# Altium schematic symbol library MCU_ST_STM32F4.SchLib: 211 symbols (part 10 of 10)
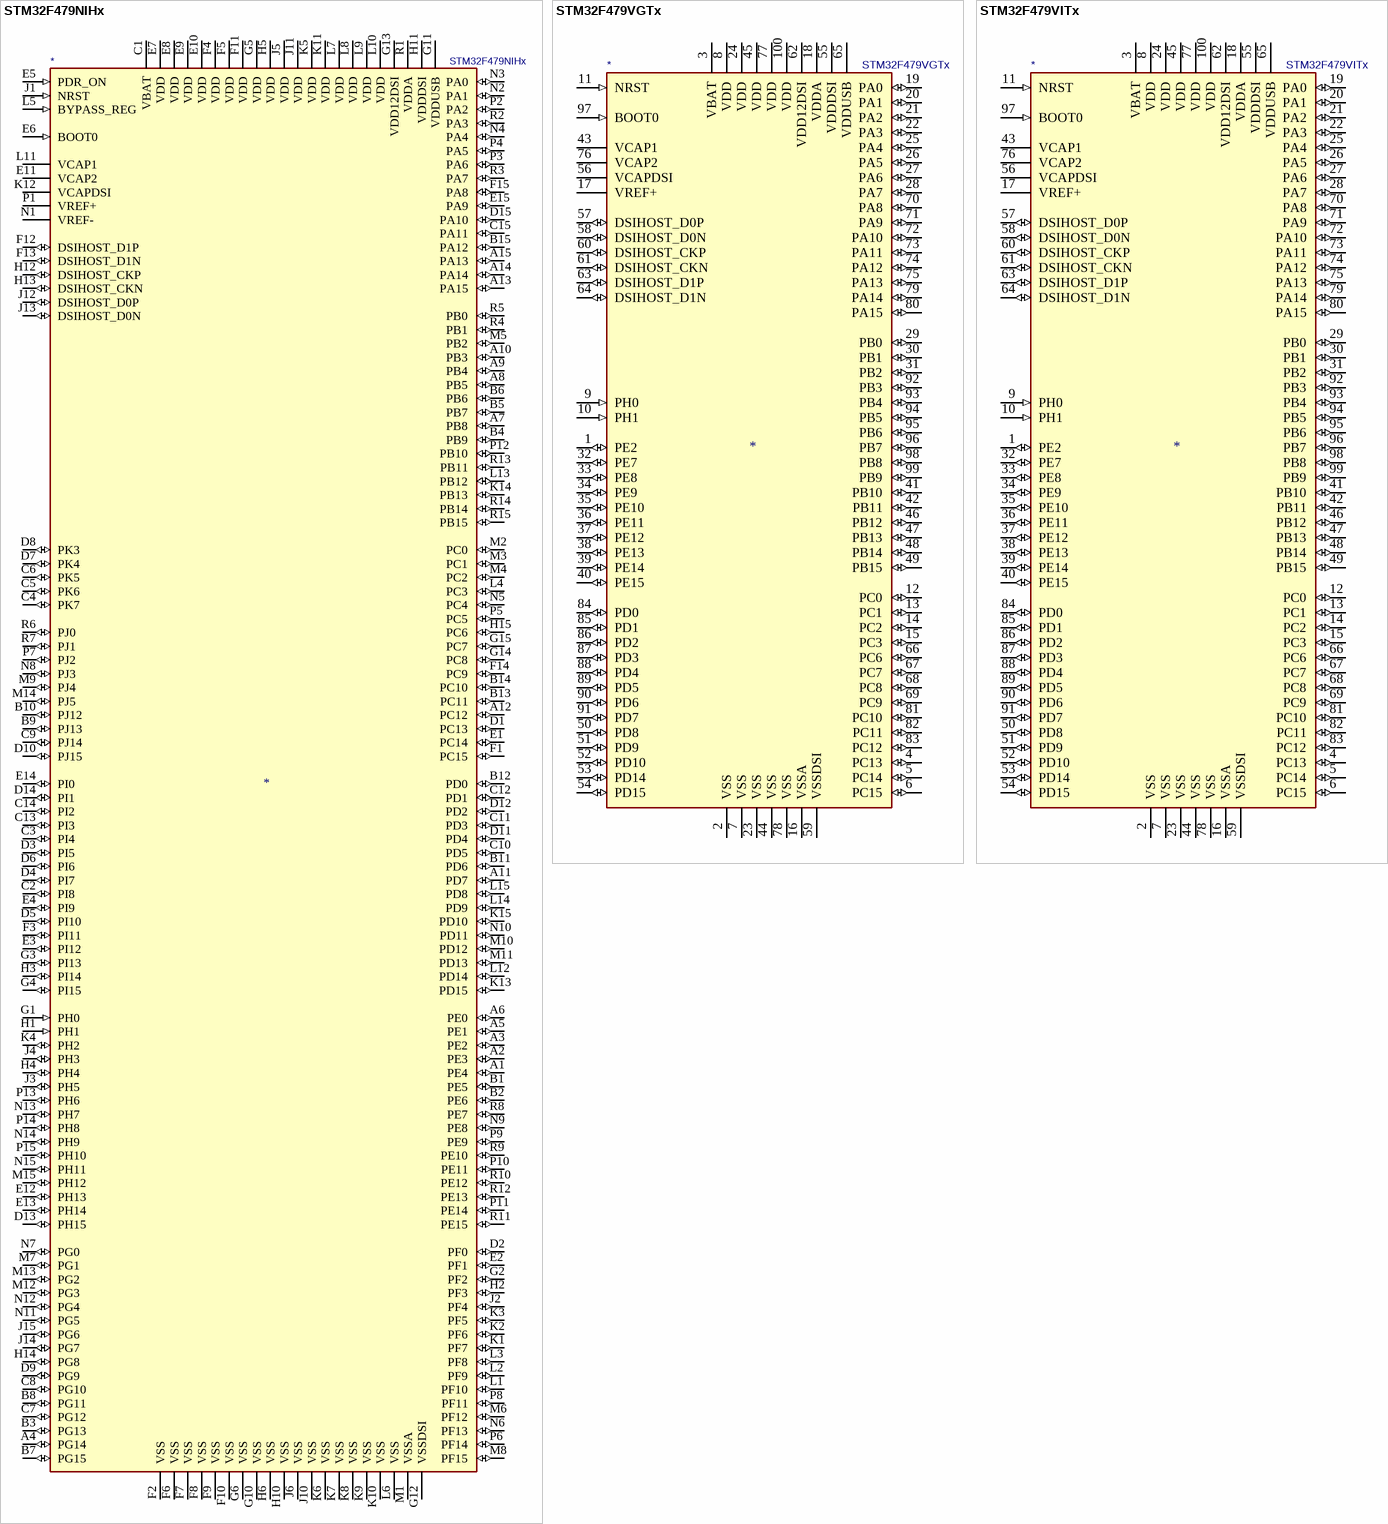
[diagram p71: symbols STM32F479NIHx to STM32F479VITx]

## STM32F479NIHx
designator *  value STM32F479NIHx
ki_keywords: ARM Cortex-M4 STM32F4 STM32F469/479; ki_description: ARM Cortex-M4 MCU, 2048KB flash, 320KB RAM, 180MHz, 1.7-3.6V, 159 GPIO, TFBGA-216; ki_fp_filters: TFBGA*13x13mm*Layout15x15*P0.8mm*; Footprint: Package_BGA:TFBGA-216_13x13mm_Layout15x15_P0.8mm; Supplier: http://www.st.com/st-web-ui/static/active/en/resource/technical/document/datasheet/DM00208574.pdf
footprint TFBGA-216_13x13mm_Layout15x15_P0.8mm
pins: A1 PE4 (io), A2 PE3 (io), A3 PE2 (io), A4 PG14 (io), A5 PE1 (io), A6 PE0 (io), A7 PB8 (io), A8 PB5 (io), A9 PB4 (io), A10 PB3 (io), A11 PD7 (io), A12 PC12 (io), A13 PA15 (io), A14 PA14 (io), A15 PA13 (io), B1 PE5 (io), B2 PE6 (io), B3 PG13 (io), B4 PB9 (io), B5 PB7 (io), B6 PB6 (io), B7 PG15 (io), B8 PG11 (io), B9 PJ13 (io), B10 PJ12 (io), B11 PD6 (io), B12 PD0 (io), B13 PC11 (io), B14 PC10 (io), B15 PA12 (io), C1 VBAT (power), C2 PI8 (io), C3 PI4 (io), C4 PK7 (io), C5 PK6 (io), C6 PK5 (io), C7 PG12 (io), C8 PG10 (io), C9 PJ14 (io), C10 PD5 (io), C11 PD3 (io), C12 PD1 (io), C13 PI3 (io), C14 PI2 (io), C15 PA11 (io), D1 PC13 (io), D2 PF0 (io), D3 PI5 (io), D4 PI7 (io), D5 PI10 (io), D6 PI6 (io), D7 PK4 (io), D8 PK3 (io), D9 PG9 (io), D10 PJ15 (io), D11 PD4 (io), D12 PD2 (io), D13 PH15 (io), D14 PI1 (io), D15 PA10 (io), E1 PC14 (io), E2 PF1 (io), E3 PI12 (io), E4 PI9 (io), E5 PDR_ON (in), E6 BOOT0 (in), E7 VDD (power), E8 VDD (power), E9 VDD (power), E10 VDD (power), E11 VCAP2 (power), E12 PH13 (io), E13 PH14 (io), E14 PI0 (io), E15 PA9 (io), F1 PC15 (io), F2 VSS (power), F3 PI11 (io), F4 VDD (power), F5 VDD (power), F6 VSS (power), F7 VSS (power), F8 VSS (power), F9 VSS (power), F10 VSS (power), F11 VDD (power), F12 DSIHOST_D1P (io), F13 DSIHOST_D1N (io), F14 PC9 (io), F15 PA8 (io), G1 PH0 (in), G2 PF2 (io), G3 PI13 (io), G4 PI15 (io), G5 VDD (power), G6 VSS (power), G10 VSS (power), G11 VDDUSB (power), G12 VSSDSI (power), G13 VDD12DSI (power), G14 PC8 (io), G15 PC7 (io), H1 PH1 (in), H2 PF3 (io), H3 PI14 (io), H4 PH4 (io), H5 VDD (power), H6 VSS (power), H10 VSS (power), H11 VDDDSI (power), H12 DSIHOST_CKP (io), H13 DSIHOST_CKN (io), H14 PG8 (io), H15 PC6 (io), J1 NRST (in), J2 PF4 (io), J3 PH5 (io), J4 PH3 (io), J5 VDD (power), J6 VSS (power), J10 VSS (power), J11 VDD (power), J12 DSIHOST_D0P (io), J13 DSIHOST_D0N (io), J14 PG7 (io), J15 PG6 (io), K1 PF7 (io), K2 PF6 (io), K3 PF5 (io), K4 PH2 (io), K5 VDD (power), K6 VSS (power), K7 VSS (power), K8 VSS (power), K9 VSS (power), K10 VSS (power), K11 VDD (power), K12 VCAPDSI (power), K13 PD15 (io), K14 PB13 (io), K15 PD10 (io), L1 PF10 (io), L2 PF9 (io), L3 PF8 (io), L4 PC3 (io), L5 BYPASS_REG (in), L6 VSS (power), L7 VDD (power), L8 VDD (power), L9 VDD (power), L10 VDD (power), L11 VCAP1 (power), L12 PD14 (io), L13 PB12 (io), L14 PD9 (io), L15 PD8 (io), M1 VSSA (power), M2 PC0 (io), M3 PC1 (io), M4 PC2 (io), M5 PB2 (io), M6 PF12 (io), M7 PG1 (io), M8 PF15 (io), M9 PJ4 (io), M10 PD12 (io), M11 PD13 (io), M12 PG3 (io), M13 PG2 (io), M14 PJ5 (io), M15 PH12 (io), N1 VREF- (power), N2 PA1 (io), N3 PA0 (io), N4 PA4 (io), N5 PC4 (io), N6 PF13 (io), N7 PG0 (io), N8 PJ3 (io), N9 PE8 (io), N10 PD11 (io), N11 PG5 (io), N12 PG4 (io), N13 PH7 (io), N14 PH9 (io), N15 PH11 (io), P1 VREF+ (power), P2 PA2 (io), P3 PA6 (io), P4 PA5 (io), P5 PC5 (io), P6 PF14 (io), P7 PJ2 (io), P8 PF11 (io), P9 PE9 (io), P10 PE11 (io), P11 PE14 (io), P12 PB10 (io), P13 PH6 (io), P14 PH8 (io), P15 PH10 (io), R1 VDDA (power), R2 PA3 (io), R3 PA7 (io), R4 PB1 (io), R5 PB0 (io), R6 PJ0 (io), R7 PJ1 (io), R8 PE7 (io), R9 PE10 (io), R10 PE12 (io), R11 PE15 (io), R12 PE13 (io), R13 PB11 (io), R14 PB14 (io), R15 PB15 (io)

## STM32F479VGTx
designator *  value STM32F479VGTx
ki_keywords: ARM Cortex-M4 STM32F4 STM32F469/479; ki_description: ARM Cortex-M4 MCU, 1024KB flash, 320KB RAM, 180MHz, 1.7-3.6V, 71 GPIO, LQFP-100; ki_fp_filters: LQFP*14x14mm*P0.5mm*; Footprint: Package_QFP:LQFP-100_14x14mm_P0.5mm; Supplier: http://www.st.com/st-web-ui/static/active/en/resource/technical/document/datasheet/DM00208574.pdf
footprint LQFP-100_14x14mm_P0.5mm
pins: 1 PE2 (io), 2 VSS (power), 3 VBAT (power), 4 PC13 (io), 5 PC14 (io), 6 PC15 (io), 7 VSS (power), 8 VDD (power), 9 PH0 (in), 10 PH1 (in), 11 NRST (in), 12 PC0 (io), 13 PC1 (io), 14 PC2 (io), 15 PC3 (io), 16 VSSA (power), 17 VREF+ (power), 18 VDDA (power), 19 PA0 (io), 20 PA1 (io), 21 PA2 (io), 22 PA3 (io), 23 VSS (power), 24 VDD (power), 25 PA4 (io), 26 PA5 (io), 27 PA6 (io), 28 PA7 (io), 29 PB0 (io), 30 PB1 (io), 31 PB2 (io), 32 PE7 (io), 33 PE8 (io), 34 PE9 (io), 35 PE10 (io), 36 PE11 (io), 37 PE12 (io), 38 PE13 (io), 39 PE14 (io), 40 PE15 (io), 41 PB10 (io), 42 PB11 (io), 43 VCAP1 (power), 44 VSS (power), 45 VDD (power), 46 PB12 (io), 47 PB13 (io), 48 PB14 (io), 49 PB15 (io), 50 PD8 (io), 51 PD9 (io), 52 PD10 (io), 53 PD14 (io), 54 PD15 (io), 55 VDDDSI (power), 56 VCAPDSI (power), 57 DSIHOST_D0P (io), 58 DSIHOST_D0N (io), 59 VSSDSI (power), 60 DSIHOST_CKP (io), 61 DSIHOST_CKN (io), 62 VDD12DSI (power), 63 DSIHOST_D1P (io), 64 DSIHOST_D1N (io), 65 VDDUSB (power), 66 PC6 (io), 67 PC7 (io), 68 PC8 (io), 69 PC9 (io), 70 PA8 (io), 71 PA9 (io), 72 PA10 (io), 73 PA11 (io), 74 PA12 (io), 75 PA13 (io), 76 VCAP2 (power), 77 VDD (power), 78 VSS (power), 79 PA14 (io), 80 PA15 (io), 81 PC10 (io), 82 PC11 (io), 83 PC12 (io), 84 PD0 (io), 85 PD1 (io), 86 PD2 (io), 87 PD3 (io), 88 PD4 (io), 89 PD5 (io), 90 PD6 (io), 91 PD7 (io), 92 PB3 (io), 93 PB4 (io), 94 PB5 (io), 95 PB6 (io), 96 PB7 (io), 97 BOOT0 (in), 98 PB8 (io), 99 PB9 (io), 100 VDD (power)

## STM32F479VITx
designator *  value STM32F479VITx
ki_keywords: ARM Cortex-M4 STM32F4 STM32F469/479; ki_description: ARM Cortex-M4 MCU, 2048KB flash, 320KB RAM, 180MHz, 1.7-3.6V, 71 GPIO, LQFP-100; ki_fp_filters: LQFP*14x14mm*P0.5mm*; Footprint: Package_QFP:LQFP-100_14x14mm_P0.5mm; Supplier: http://www.st.com/st-web-ui/static/active/en/resource/technical/document/datasheet/DM00208574.pdf
footprint LQFP-100_14x14mm_P0.5mm
pins: 1 PE2 (io), 2 VSS (power), 3 VBAT (power), 4 PC13 (io), 5 PC14 (io), 6 PC15 (io), 7 VSS (power), 8 VDD (power), 9 PH0 (in), 10 PH1 (in), 11 NRST (in), 12 PC0 (io), 13 PC1 (io), 14 PC2 (io), 15 PC3 (io), 16 VSSA (power), 17 VREF+ (power), 18 VDDA (power), 19 PA0 (io), 20 PA1 (io), 21 PA2 (io), 22 PA3 (io), 23 VSS (power), 24 VDD (power), 25 PA4 (io), 26 PA5 (io), 27 PA6 (io), 28 PA7 (io), 29 PB0 (io), 30 PB1 (io), 31 PB2 (io), 32 PE7 (io), 33 PE8 (io), 34 PE9 (io), 35 PE10 (io), 36 PE11 (io), 37 PE12 (io), 38 PE13 (io), 39 PE14 (io), 40 PE15 (io), 41 PB10 (io), 42 PB11 (io), 43 VCAP1 (power), 44 VSS (power), 45 VDD (power), 46 PB12 (io), 47 PB13 (io), 48 PB14 (io), 49 PB15 (io), 50 PD8 (io), 51 PD9 (io), 52 PD10 (io), 53 PD14 (io), 54 PD15 (io), 55 VDDDSI (power), 56 VCAPDSI (power), 57 DSIHOST_D0P (io), 58 DSIHOST_D0N (io), 59 VSSDSI (power), 60 DSIHOST_CKP (io), 61 DSIHOST_CKN (io), 62 VDD12DSI (power), 63 DSIHOST_D1P (io), 64 DSIHOST_D1N (io), 65 VDDUSB (power), 66 PC6 (io), 67 PC7 (io), 68 PC8 (io), 69 PC9 (io), 70 PA8 (io), 71 PA9 (io), 72 PA10 (io), 73 PA11 (io), 74 PA12 (io), 75 PA13 (io), 76 VCAP2 (power), 77 VDD (power), 78 VSS (power), 79 PA14 (io), 80 PA15 (io), 81 PC10 (io), 82 PC11 (io), 83 PC12 (io), 84 PD0 (io), 85 PD1 (io), 86 PD2 (io), 87 PD3 (io), 88 PD4 (io), 89 PD5 (io), 90 PD6 (io), 91 PD7 (io), 92 PB3 (io), 93 PB4 (io), 94 PB5 (io), 95 PB6 (io), 96 PB7 (io), 97 BOOT0 (in), 98 PB8 (io), 99 PB9 (io), 100 VDD (power)

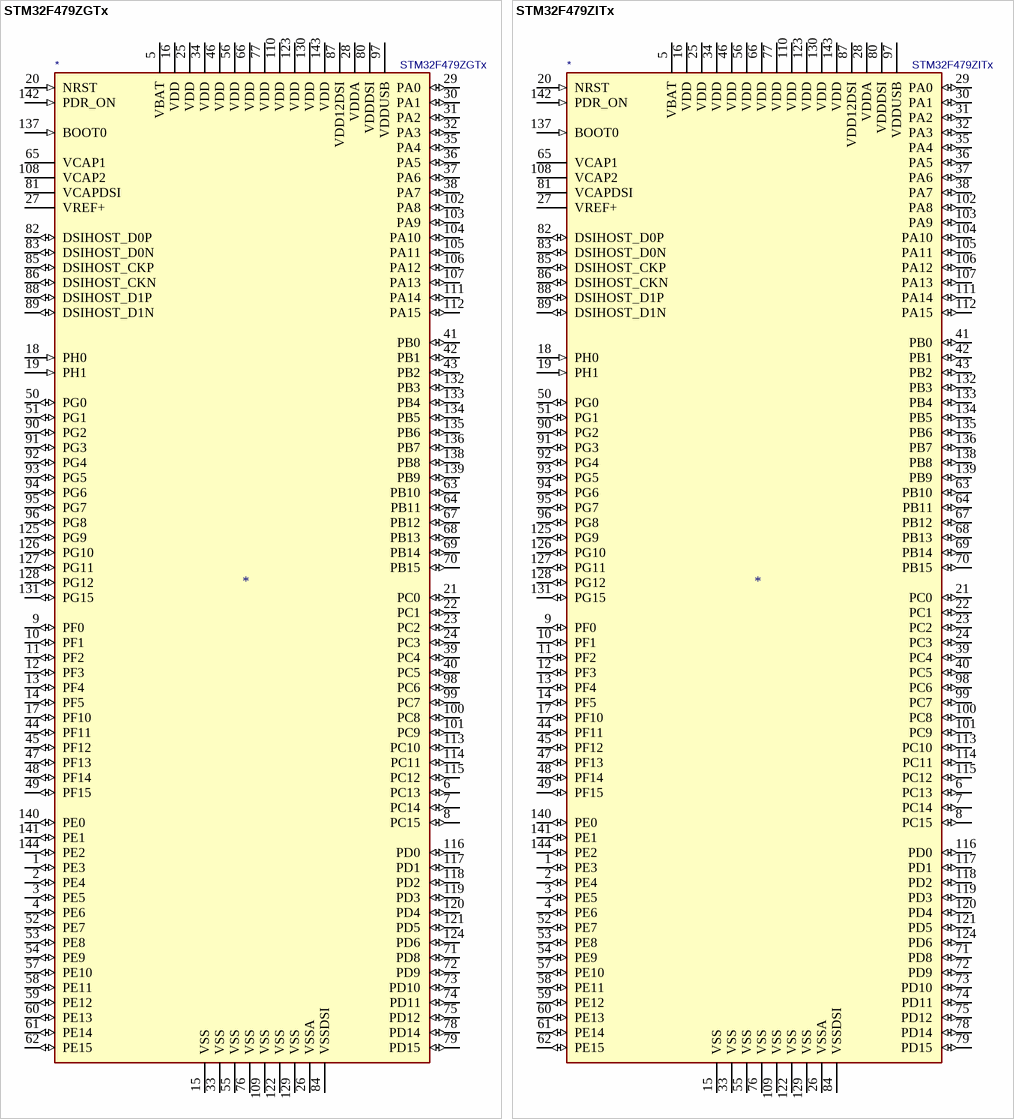
[diagram p62: symbols STM32F479ZGTx to STM32F479ZITx]

## STM32F479ZGTx
designator *  value STM32F479ZGTx
ki_keywords: ARM Cortex-M4 STM32F4 STM32F469/479; ki_description: ARM Cortex-M4 MCU, 1024KB flash, 320KB RAM, 180MHz, 1.7-3.6V, 106 GPIO, LQFP-144; ki_fp_filters: LQFP*20x20mm*P0.5mm*; Footprint: Package_QFP:LQFP-144_20x20mm_P0.5mm; Supplier: http://www.st.com/st-web-ui/static/active/en/resource/technical/document/datasheet/DM00208574.pdf
footprint LQFP-144_20x20mm_P0.5mm
pins: 1 PE3 (io), 2 PE4 (io), 3 PE5 (io), 4 PE6 (io), 5 VBAT (power), 6 PC13 (io), 7 PC14 (io), 8 PC15 (io), 9 PF0 (io), 10 PF1 (io), 11 PF2 (io), 12 PF3 (io), 13 PF4 (io), 14 PF5 (io), 15 VSS (power), 16 VDD (power), 17 PF10 (io), 18 PH0 (in), 19 PH1 (in), 20 NRST (in), 21 PC0 (io), 22 PC1 (io), 23 PC2 (io), 24 PC3 (io), 25 VDD (power), 26 VSSA (power), 27 VREF+ (power), 28 VDDA (power), 29 PA0 (io), 30 PA1 (io), 31 PA2 (io), 32 PA3 (io), 33 VSS (power), 34 VDD (power), 35 PA4 (io), 36 PA5 (io), 37 PA6 (io), 38 PA7 (io), 39 PC4 (io), 40 PC5 (io), 41 PB0 (io), 42 PB1 (io), 43 PB2 (io), 44 PF11 (io), 45 PF12 (io), 46 VDD (power), 47 PF13 (io), 48 PF14 (io), 49 PF15 (io), 50 PG0 (io), 51 PG1 (io), 52 PE7 (io), 53 PE8 (io), 54 PE9 (io), 55 VSS (power), 56 VDD (power), 57 PE10 (io), 58 PE11 (io), 59 PE12 (io), 60 PE13 (io), 61 PE14 (io), 62 PE15 (io), 63 PB10 (io), 64 PB11 (io), 65 VCAP1 (power), 66 VDD (power), 67 PB12 (io), 68 PB13 (io), 69 PB14 (io), 70 PB15 (io), 71 PD8 (io), 72 PD9 (io), 73 PD10 (io), 74 PD11 (io), 75 PD12 (io), 76 VSS (power), 77 VDD (power), 78 PD14 (io), 79 PD15 (io), 80 VDDDSI (power), 81 VCAPDSI (power), 82 DSIHOST_D0P (io), 83 DSIHOST_D0N (io), 84 VSSDSI (power), 85 DSIHOST_CKP (io), 86 DSIHOST_CKN (io), 87 VDD12DSI (power), 88 DSIHOST_D1P (io), 89 DSIHOST_D1N (io), 90 PG2 (io), 91 PG3 (io), 92 PG4 (io), 93 PG5 (io), 94 PG6 (io), 95 PG7 (io), 96 PG8 (io), 97 VDDUSB (power), 98 PC6 (io), 99 PC7 (io), 100 PC8 (io), 101 PC9 (io), 102 PA8 (io), 103 PA9 (io), 104 PA10 (io), 105 PA11 (io), 106 PA12 (io), 107 PA13 (io), 108 VCAP2 (power), 109 VSS (power), 110 VDD (power), 111 PA14 (io), 112 PA15 (io), 113 PC10 (io), 114 PC11 (io), 115 PC12 (io), 116 PD0 (io), 117 PD1 (io), 118 PD2 (io), 119 PD3 (io), 120 PD4 (io), 121 PD5 (io), 122 VSS (power), 123 VDD (power), 124 PD6 (io), 125 PG9 (io), 126 PG10 (io), 127 PG11 (io), 128 PG12 (io), 129 VSS (power), 130 VDD (power), 131 PG15 (io), 132 PB3 (io), 133 PB4 (io), 134 PB5 (io), 135 PB6 (io), 136 PB7 (io), 137 BOOT0 (in), 138 PB8 (io), 139 PB9 (io), 140 PE0 (io), 141 PE1 (io), 142 PDR_ON (in), 143 VDD (power), 144 PE2 (io)

## STM32F479ZITx
designator *  value STM32F479ZITx
ki_keywords: ARM Cortex-M4 STM32F4 STM32F469/479; ki_description: ARM Cortex-M4 MCU, 2048KB flash, 320KB RAM, 180MHz, 1.7-3.6V, 106 GPIO, LQFP-144; ki_fp_filters: LQFP*20x20mm*P0.5mm*; Footprint: Package_QFP:LQFP-144_20x20mm_P0.5mm; Supplier: http://www.st.com/st-web-ui/static/active/en/resource/technical/document/datasheet/DM00208574.pdf
footprint LQFP-144_20x20mm_P0.5mm
pins: 1 PE3 (io), 2 PE4 (io), 3 PE5 (io), 4 PE6 (io), 5 VBAT (power), 6 PC13 (io), 7 PC14 (io), 8 PC15 (io), 9 PF0 (io), 10 PF1 (io), 11 PF2 (io), 12 PF3 (io), 13 PF4 (io), 14 PF5 (io), 15 VSS (power), 16 VDD (power), 17 PF10 (io), 18 PH0 (in), 19 PH1 (in), 20 NRST (in), 21 PC0 (io), 22 PC1 (io), 23 PC2 (io), 24 PC3 (io), 25 VDD (power), 26 VSSA (power), 27 VREF+ (power), 28 VDDA (power), 29 PA0 (io), 30 PA1 (io), 31 PA2 (io), 32 PA3 (io), 33 VSS (power), 34 VDD (power), 35 PA4 (io), 36 PA5 (io), 37 PA6 (io), 38 PA7 (io), 39 PC4 (io), 40 PC5 (io), 41 PB0 (io), 42 PB1 (io), 43 PB2 (io), 44 PF11 (io), 45 PF12 (io), 46 VDD (power), 47 PF13 (io), 48 PF14 (io), 49 PF15 (io), 50 PG0 (io), 51 PG1 (io), 52 PE7 (io), 53 PE8 (io), 54 PE9 (io), 55 VSS (power), 56 VDD (power), 57 PE10 (io), 58 PE11 (io), 59 PE12 (io), 60 PE13 (io), 61 PE14 (io), 62 PE15 (io), 63 PB10 (io), 64 PB11 (io), 65 VCAP1 (power), 66 VDD (power), 67 PB12 (io), 68 PB13 (io), 69 PB14 (io), 70 PB15 (io), 71 PD8 (io), 72 PD9 (io), 73 PD10 (io), 74 PD11 (io), 75 PD12 (io), 76 VSS (power), 77 VDD (power), 78 PD14 (io), 79 PD15 (io), 80 VDDDSI (power), 81 VCAPDSI (power), 82 DSIHOST_D0P (io), 83 DSIHOST_D0N (io), 84 VSSDSI (power), 85 DSIHOST_CKP (io), 86 DSIHOST_CKN (io), 87 VDD12DSI (power), 88 DSIHOST_D1P (io), 89 DSIHOST_D1N (io), 90 PG2 (io), 91 PG3 (io), 92 PG4 (io), 93 PG5 (io), 94 PG6 (io), 95 PG7 (io), 96 PG8 (io), 97 VDDUSB (power), 98 PC6 (io), 99 PC7 (io), 100 PC8 (io), 101 PC9 (io), 102 PA8 (io), 103 PA9 (io), 104 PA10 (io), 105 PA11 (io), 106 PA12 (io), 107 PA13 (io), 108 VCAP2 (power), 109 VSS (power), 110 VDD (power), 111 PA14 (io), 112 PA15 (io), 113 PC10 (io), 114 PC11 (io), 115 PC12 (io), 116 PD0 (io), 117 PD1 (io), 118 PD2 (io), 119 PD3 (io), 120 PD4 (io), 121 PD5 (io), 122 VSS (power), 123 VDD (power), 124 PD6 (io), 125 PG9 (io), 126 PG10 (io), 127 PG11 (io), 128 PG12 (io), 129 VSS (power), 130 VDD (power), 131 PG15 (io), 132 PB3 (io), 133 PB4 (io), 134 PB5 (io), 135 PB6 (io), 136 PB7 (io), 137 BOOT0 (in), 138 PB8 (io), 139 PB9 (io), 140 PE0 (io), 141 PE1 (io), 142 PDR_ON (in), 143 VDD (power), 144 PE2 (io)